# Altium footprint library ALL.PcbLib: 385 footprints (part 22 of 25)
Each footprint in its own frame and in the unit in brackets; x right, y up, seen from the top. Pads: shape width x height; smd on the part's side, far side on the other; paste and mask are expansions set on the pad; w line width, h text height; cw(c..) or ccw(c..) is an arc to the next point about the centre after c.
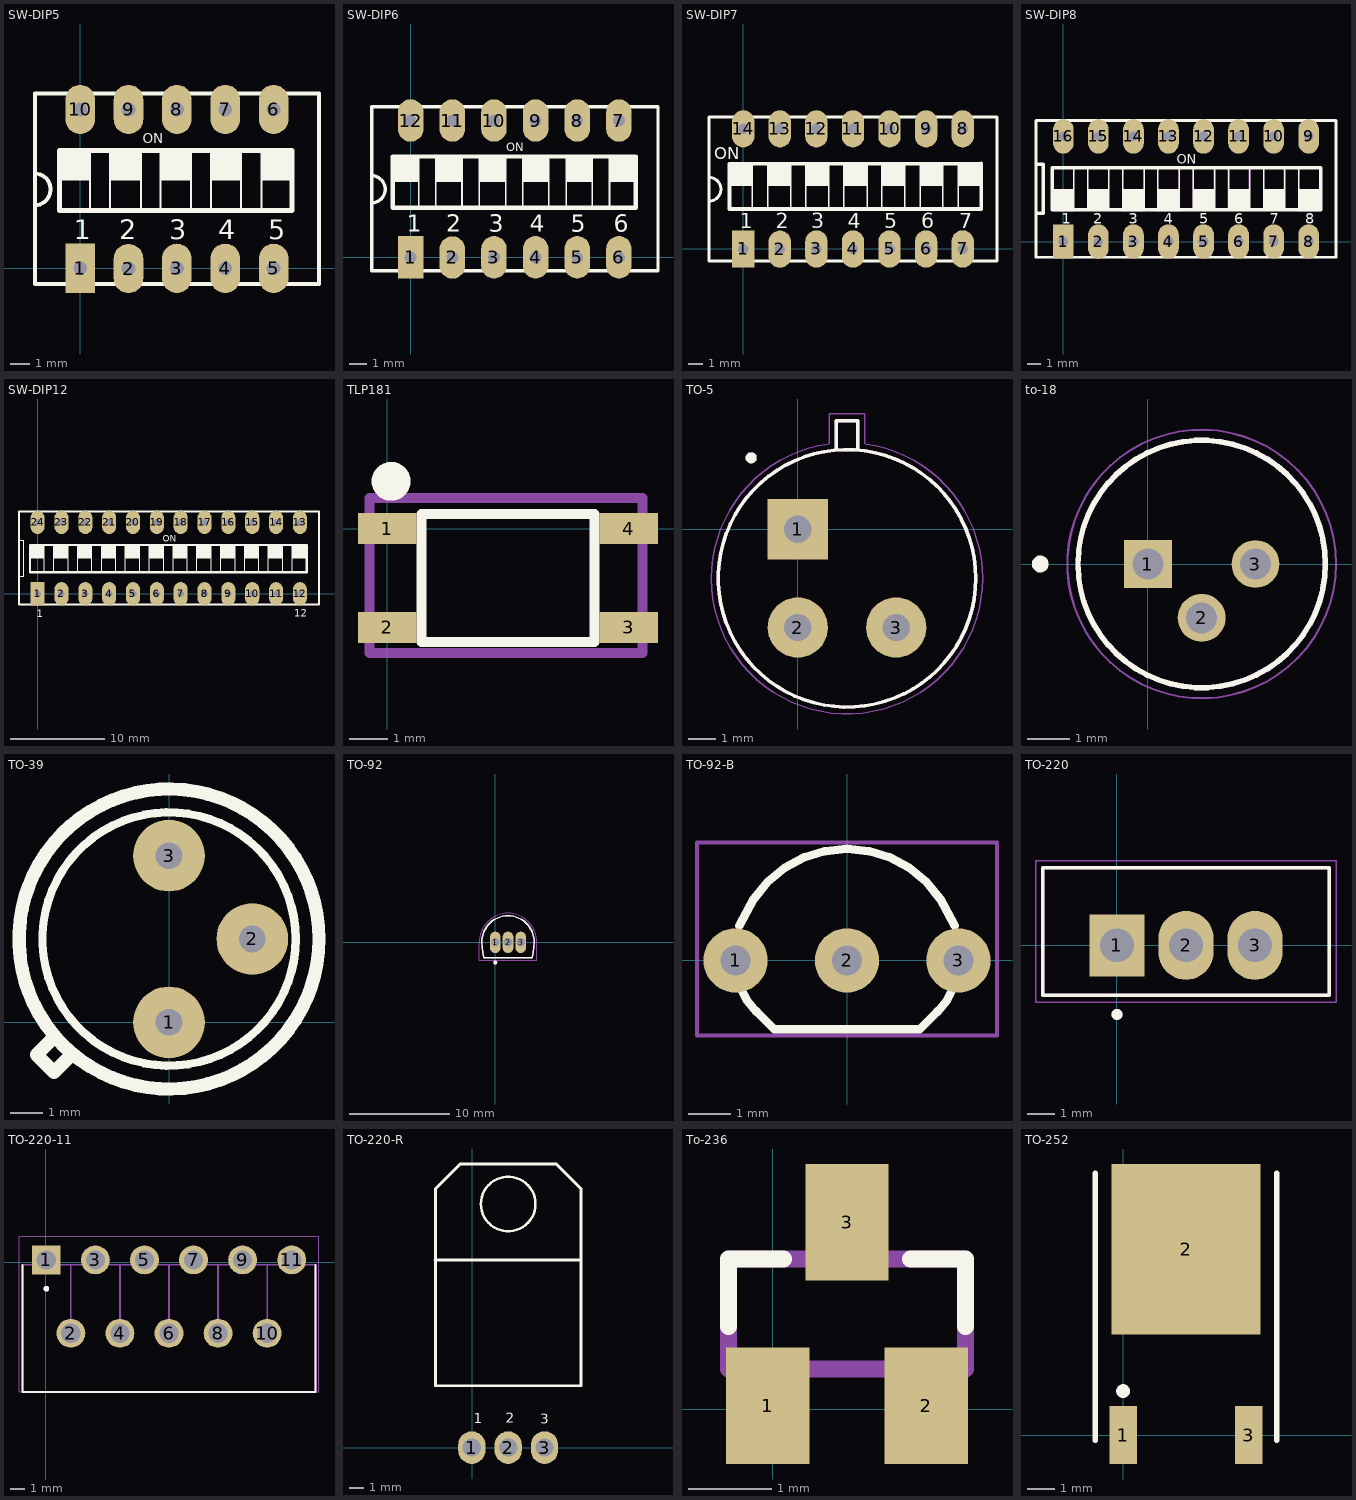
[diagram p21: the footprints below, top view; thin cyan lines are the x and y axes]

## SW-DIP5 [mm]
pads (10):
  rect 1.5x2.5 hole 0.7: 1(0,0)
  oval 1.5x2.5 hole 0.7: 2(2.45,-0.01) 3(4.9,0) 4(7.35,0) 5(9.8,0) 6(9.8,8.05) 7(7.35,8.05) 8(4.9,8.05) 9(2.45,8.05) 10(0,8.05)
Top Overlay:
  region: -1.046,5.97 -1.046,4.445 0.51,4.445 0.51,5.97
  region: 1.504,5.97 1.504,4.445 3.06,4.445 3.06,5.97
  region: 4.058,5.97 4.058,4.445 5.614,4.445 5.614,5.97
  region: 6.614,5.97 6.614,4.445 8.17,4.445 8.17,5.97
  region: 9.164,5.97 9.164,4.445 10.72,4.445 10.72,5.97
  lines w0.1: 0.5,2.92 0.5,5.94 ; 1.51,2.92 1.51,5.94 ; 3.07,2.92 3.07,5.94 ; 4.07,2.92 4.07,5.94 ; 5.61,2.92 5.61,5.94 ; 6.63,2.92 6.63,5.94 ; 8.16,2.92 8.16,5.94 ; 9.18,2.92 9.18,5.94
  lines w0.2: -2.3,3.202 ccw(c-2.3,4.002) -2.3,4.802 ; -2.3,-0.8 12.1,-0.8 12.1,8.85 -2.3,8.85 -2.3,-0.8
  lines w0.25: -1.04,2.92 -1.04,5.97
  lines w0.254: -1.04,2.92 10.72,2.92 10.72,5.97 -1.04,5.97
  text "5" at 9.52,1.465 h1
  text "4" at 6.99,1.465 h1
  text "3" at 4.5,1.465 h1
  text "2" at 1.98,1.465 h1
  text "1" at -0.33,1.465 h1
  text "ON" at 3.17,6.33 h0.5
3D body "User Library-Switch DIP 5 way flat slide Thru-Hole-19624.step": height 7.2, standoff -2, extent -2.22,-0.93 12.04,8.97

## SW-DIP6 [mm]
pads (12):
  rect 1.5x2.5 hole 0.7: 1(0,0)
  oval 1.5x2.5 hole 0.7: 2(2.45,-0.01) 3(4.9,0) 4(7.35,0) 5(9.8,0) 6(12.25,0) 7(12.25,8.05) 8(9.8,8.05) 9(7.35,8.05) 10(4.9,8.05) 11(2.45,8.05) 12(0,8.05)
Top Overlay:
  region: 11.684,5.96 11.684,4.435 13.24,4.435 13.24,5.96
  region: 9.134,5.96 9.134,4.435 10.69,4.435 10.69,5.96
  region: 6.578,5.96 6.578,4.435 8.134,4.435 8.134,5.96
  region: 4.024,5.96 4.024,4.435 5.58,4.435 5.58,5.96
  region: 1.474,5.96 1.474,4.435 3.03,4.435 3.03,5.96
  region: -1.076,5.96 -1.076,4.435 0.48,4.435 0.48,5.96
  lines w0.1: 0.47,2.91 0.47,5.93 ; 1.48,2.91 1.48,5.93 ; 3.02,2.91 3.02,5.93 ; 4.03,2.91 4.03,5.93 ; 5.59,2.91 5.59,5.93 ; 6.59,2.91 6.59,5.93 ; 8.13,2.91 8.13,5.93 ; 9.15,2.91 9.15,5.93 ; 10.68,2.91 10.68,5.93 ; 11.7,2.91 11.7,5.93
  lines w0.2: -2.3,3.202 ccw(c-2.3,4.002) -2.3,4.802 ; -2.3,-0.8 -2.3,8.85 14.55,8.85 14.55,-0.8 -2.3,-0.8
  lines w0.25: -1.06,2.91 -1.06,5.93
  lines w0.254: -1.06,2.91 13.24,2.91 13.24,5.93 -1.06,5.93
  text "ON" at 5.63,6.23 h0.5
  text "1" at -0.23,1.495 h1
  text "2" at 2.08,1.495 h1
  text "3" at 4.6,1.495 h1
  text "4" at 6.99,1.495 h1
  text "5" at 9.42,1.495 h1
  text "6" at 11.94,1.495 h1
3D body "User Library-106S.STEP": height 6.43, standoff -2.42, extent -2.19,-0.82 14.51,8.88

## SW-DIP7 [mm]
pads (14):
  rect 1.5x2.5 hole 0.7: 1(0,0)
  oval 1.5x2.5 hole 0.7: 2(2.45,-0.01) 3(4.9,0) 4(7.35,0) 5(9.8,0) 6(12.25,0) 7(14.7,0) 8(14.7,8.05) 9(12.25,8.05) 10(9.8,8.05) 11(7.35,8.05) 12(4.9,8.05) 13(2.45,8.05) 14(0,8.05)
Top Overlay:
  region: 14.384,5.73 14.384,4.205 15.94,4.205 15.94,5.73
  region: 11.834,5.73 11.834,4.205 13.39,4.205 13.39,5.73
  region: 9.278,5.73 9.278,4.205 10.834,4.205 10.834,5.73
  region: 6.724,5.73 6.724,4.205 8.28,4.205 8.28,5.73
  region: 4.174,5.73 4.174,4.205 5.73,4.205 5.73,5.73
  region: 1.624,5.73 1.624,4.205 3.18,4.205 3.18,5.73
  region: -0.936,5.73 -0.936,4.205 0.62,4.205 0.62,5.73
  lines w0.1: 0.61,2.68 0.61,5.7 ; 1.64,2.68 1.64,5.7 ; 3.17,2.68 3.17,5.7 ; 4.18,2.68 4.18,5.7 ; 5.72,2.68 5.72,5.7 ; 6.73,2.68 6.73,5.7 ; 8.29,2.68 8.29,5.7 ; 9.29,2.68 9.29,5.7 ; 10.83,2.68 10.83,5.7 ; 11.85,2.68 11.85,5.7 ; 13.38,2.68 13.38,5.7 ; 14.4,2.68 14.4,5.7
  lines w0.2: -2.3,3.202 ccw(c-2.3,4.002) -2.3,4.802 ; -2.3,-0.8 -2.3,8.85 17,8.85 17,-0.8 -2.3,-0.8
  lines w0.25: -0.92,2.68 -0.92,5.7
  lines w0.254: -0.92,2.68 15.94,2.68 15.94,5.73 -0.92,5.7
  text "ON" at -1.93,6.02 h0.8
  text "1" at -0.23,1.395 h1
  text "2" at 2.16,1.395 h1
  text "3" at 4.57,1.395 h1
  text "4" at 6.99,1.395 h1
  text "5" at 9.43,1.395 h1
  text "6" at 11.94,1.395 h1
  text "7" at 14.47,1.395 h1
3D body "User Library-DIPSWITCH7.step": height 7, standoff -3.1, extent -2.29,-1 16.85,9.16

## SW-DIP8 [mm]
pads (16):
  rect 1.5x2.5 hole 0.7: 1(0,0)
  oval 1.5x2.5 hole 0.7: 2(2.54,-0.01) 3(5.08,0) 4(7.62,0) 5(10.16,0) 6(12.7,0) 7(15.24,0) 8(17.78,0) 9(17.78,7.62) 10(15.24,7.62) 11(12.7,7.62) 12(10.16,7.62) 13(7.62,7.62) 14(5.08,7.62) 15(2.54,7.62) 16(0,7.62)
Top Overlay:
  region: 0.759,2.297 0.759,3.822 -0.797,3.822 -0.797,2.297
  region: 3.309,2.297 3.309,3.822 1.753,3.822 1.753,2.297
  region: 5.866,2.297 5.866,3.822 4.309,3.822 4.309,2.297
  region: 8.419,2.297 8.419,3.822 6.863,3.822 6.863,2.297
  region: 10.969,2.297 10.969,3.822 9.413,3.822 9.413,2.297
  region: 13.519,2.297 13.519,3.822 11.963,3.822 11.963,2.297
  region: 16.079,2.297 16.079,3.822 14.523,3.822 14.523,2.297
  region: 18.629,2.297 18.629,3.822 17.073,3.822 17.073,2.297
  lines w0.1: 0.743,2.327 0.743,5.347 ; 1.763,2.327 1.763,5.347 ; 3.293,2.327 3.293,5.347 ; 4.313,2.327 4.313,5.347 ; 5.853,2.327 5.853,5.347 ; 6.853,2.327 6.853,5.347 ; 8.413,2.327 8.413,5.347 ; 9.423,2.327 9.423,5.347 ; 10.963,2.327 10.963,5.347 ; 11.973,2.327 11.973,5.347 ; 13.503,2.327 13.503,5.347 ; 14.533,2.327 14.533,5.347 ; 16.063,2.327 16.063,5.347 ; 17.073,2.327 17.073,5.347
  lines w0.2: -1.981,-1.143 -1.981,8.763 19.761,8.763 19.761,-1.143 -1.981,-1.143
  lines w0.254: -1.94,2.032 -1.473,2.032 -1.473,5.588 -1.93,5.588 ; -0.797,2.297 18.653,2.297 18.653,5.347 -0.797,5.347 -0.797,2.297
  text "ON" at 8.23,5.65 h0.7
  text "1" at -0.101,1.295 h0.76
  text "2" at 2.163,1.295 h0.76
  text "3" at 4.723,1.295 h0.76
  text "4" at 7.284,1.295 h0.76
  text "5" at 9.844,1.295 h0.76
  text "6" at 12.405,1.295 h0.76
  text "7" at 14.965,1.295 h0.76
  text "8" at 17.526,1.295 h0.76
Mechanical 1:
  circle w0.025: c0,0 r0.254
  circle w0.025: c0,7.62 r0.254
  circle w0.025: c2.54,7.62 r0.254
  circle w0.025: c2.54,-0.01 r0.254
  circle w0.025: c5.08,0 r0.254
  circle w0.025: c5.08,7.62 r0.254
  circle w0.025: c7.62,7.62 r0.254
  circle w0.025: c7.62,0 r0.254
  circle w0.025: c10.16,0 r0.254
  circle w0.025: c10.16,7.62 r0.254
  circle w0.025: c12.7,7.62 r0.254
  circle w0.025: c12.7,0 r0.254
  circle w0.025: c15.24,0 r0.254
  circle w0.025: c15.24,7.62 r0.254
  circle w0.025: c17.78,7.62 r0.254
  circle w0.025: c17.78,0 r0.254
  lines w0.025: 0.762,5.334 0.762,5.41 -0.813,5.41 -0.813,2.235 0.762,2.235 0.762,5.359 ; 4.318,5.334 5.867,5.334 5.867,2.235 4.318,2.235 4.318,5.359 ; 6.833,5.309 8.407,5.309 8.407,2.235 6.833,2.235 6.833,5.359 ; 9.423,5.359 10.947,5.359 10.947,2.261 9.423,2.261 9.423,5.385 ; 11.938,5.309 13.487,5.309 13.487,2.261 11.938,2.261 11.938,5.359 ; 14.529,5.334 14.529,2.261 16.027,2.261 16.027,5.359 14.529,5.359 ; 17.069,5.334 18.694,5.334 18.694,2.235 17.069,2.235 17.069,5.359 ; -1.981,-1.143 19.761,-1.143 19.761,8.763 -1.981,8.763 -1.981,-1.143 ; -1.981,2.032 -1.981,5.588 -1.473,5.588 -1.473,2.032 -1.981,2.032 ; 1.778,2.261 3.302,2.261 3.302,5.334 1.778,5.334 1.778,2.261
3D body: height 5.59, standoff 0, extent 18.693,2.235 19.761,5.41
3D body: height 5.59, standoff 0, extent 16.154,2.236 17.069,5.411
3D body: height 5.59, standoff 0, extent 13.487,2.261 14.529,5.436
3D body: height 5.59, standoff 0, extent 11.048,2.262 11.938,5.437
3D body: height 5.59, standoff 0, extent 8.407,2.236 9.423,5.411
3D body: height 5.59, standoff 0, extent 5.866,2.236 6.832,5.411
3D body: height 5.59, standoff 0, extent 3.403,2.236 4.318,5.411
3D body: height 5.59, standoff 0, extent 0.762,2.235 1.778,5.41
3D body: height 5.59, standoff 0, extent -1.473,2.235 -0.813,5.41
3D body: height 5.59, standoff 0, extent -1.981,5.41 19.761,8.763
3D body: height 5.59, standoff 0, extent -1.981,-1.143 19.761,2.236
3D body: height 3.81, standoff 0, extent -1.981,2.032 -1.473,5.613
3D body: height 0.76, standoff 0, extent 2.287,7.367 2.793,7.873
3D body: height 0.76, standoff 0, extent 4.827,7.367 5.333,7.873
3D body: height 0.76, standoff 0, extent 7.367,7.367 7.873,7.873
3D body: height 0.76, standoff 0, extent -0.253,7.367 0.253,7.873
3D body: height 0.76, standoff 0, extent 17.527,7.367 18.033,7.873
3D body: height 0.76, standoff 0, extent 12.447,7.367 12.953,7.873
3D body: height 0.76, standoff 0, extent 14.987,7.367 15.493,7.873
3D body: height 5.08, standoff 0, extent 4.318,2.236 5.866,5.334
3D body: height 0.76, standoff 0, extent -0.253,-0.253 0.253,0.253
3D body: height 0.76, standoff 0, extent 2.287,-0.263 2.793,0.243
3D body: height 0.76, standoff 0, extent 4.827,-0.253 5.333,0.253
3D body: height 0.76, standoff 0, extent 7.367,-0.253 7.873,0.253
3D body: height 5.08, standoff 0, extent 6.832,2.339 8.405,5.411
3D body: height 5.08, standoff 0, extent 14.528,2.26 16.028,5.36
3D body: height 5.08, standoff 0, extent 17.069,2.313 18.693,5.411
3D body: height 0.76, standoff 0, extent 9.907,-0.253 10.413,0.253
3D body: height 0.76, standoff 0, extent 12.447,-0.253 12.953,0.253
3D body: height 0.76, standoff 0, extent 14.987,-0.253 15.493,0.253
3D body: height 0.76, standoff 0, extent 17.527,-0.253 18.033,0.253
3D body: height 5.08, standoff 0, extent 14.529,2.338 16.153,5.436
3D body: height 5.08, standoff 0, extent 11.938,2.339 13.563,5.437
3D body: height 5.08, standoff 0, extent 9.423,2.262 11.048,5.359
3D body: height 5.08, standoff 0, extent 1.778,2.312 3.403,5.41
3D body: height 5.08, standoff 0, extent -0.813,2.312 0.812,5.41
3D body: height 6.35, standoff 0, extent -0.813,2.235 0.812,3.759
3D body: height 6.35, standoff 0, extent 1.778,2.261 3.403,3.785
3D body: height 6.35, standoff 0, extent 4.318,2.236 5.943,3.76
3D body: height 6.35, standoff 0, extent 6.833,2.236 8.457,3.76
3D body: height 6.35, standoff 0, extent 9.423,2.262 11.048,3.786
3D body: height 6.35, standoff 0, extent 11.938,2.261 13.563,3.785
3D body: height 6.35, standoff 0, extent 14.529,2.236 16.154,3.76
3D body: height 6.35, standoff 0, extent 17.069,2.235 18.693,3.759
3D body: height 0.76, standoff 0, extent 9.867,7.337 10.373,7.843
3D body: height 5.59, standoff 0.25, extent 0.959,5.745 2.525,7.297
3D body: height 5.59, standoff 0.03, extent -0.394,5.82 0.414,7.237
3D body: height 5.59, standoff 0.25, extent -0.796,5.735 0.822,7.309

## SW-DIP12 [mm]
pads (24):
  rect 1.5x2.5 hole 0.7: 1(0,0)
  oval 1.5x2.5 hole 0.7: 2(2.54,0) 3(5.08,0) 4(7.62,0) 5(10.16,0) 6(12.7,0) 7(15.24,0) 8(17.78,0) 9(20.32,0) 10(22.86,0) 11(25.4,0) 12(27.94,0) 13(27.94,7.62) 14(25.4,7.62) 15(22.86,7.62) 16(20.32,7.62) 17(17.78,7.62) 18(15.24,7.62) 19(12.7,7.62) 20(10.16,7.62) 21(7.62,7.62) 22(5.08,7.62) 23(2.54,7.62) 24(0,7.62)
Top Overlay:
  region: 0.712,3.752 0.712,5.198 -0.812,5.198 -0.812,3.752
  region: 3.252,3.752 3.252,5.198 1.728,5.198 1.728,3.752
  region: 5.792,3.752 5.792,5.198 4.268,5.198 4.268,3.752
  region: 8.332,3.752 8.332,5.198 6.808,5.198 6.808,3.752
  region: 10.872,3.752 10.872,5.198 9.348,5.198 9.348,3.752
  region: 13.412,3.752 13.412,5.198 11.888,5.198 11.888,3.752
  region: 15.952,3.752 15.952,5.198 14.428,5.198 14.428,3.752
  region: 18.492,3.752 18.492,5.198 16.968,5.198 16.968,3.752
  region: 21.032,3.752 21.032,5.198 19.508,5.198 19.508,3.752
  region: 23.572,3.752 23.572,5.198 22.048,5.198 22.048,3.752
  region: 26.112,3.752 26.112,5.198 24.588,5.198 24.588,3.752
  region: 28.652,3.752 28.652,5.198 27.128,5.198 27.128,3.752
  lines w0.1: -0.812,2.307 -0.812,5.198 ; 0.712,2.307 0.712,5.198 ; 1.728,2.307 1.728,5.198 ; 3.252,2.307 3.252,5.198 ; 4.268,2.307 4.268,5.198 ; 5.792,2.307 5.792,5.198 ; 6.808,2.307 6.808,5.198 ; 8.332,2.307 8.332,5.198 ; 9.348,2.307 9.348,5.198 ; 10.872,2.307 10.872,5.198 ; 11.888,2.307 11.888,5.198 ; 13.412,2.307 13.412,5.198 ; 14.428,2.307 14.428,5.198 ; 15.952,2.307 15.952,5.198 ; 16.968,2.307 16.968,5.198 ; 18.492,2.307 18.492,5.198 ; 19.508,2.307 19.508,5.198 ; 21.032,2.307 21.032,5.198 ; 22.048,2.307 22.048,5.198 ; 23.572,2.307 23.572,5.198 ; 24.588,2.307 24.588,5.198 ; 26.112,2.307 26.112,5.198 ; 27.128,2.307 27.128,5.198
  lines w0.127: -1.981,1.9 -1.473,1.9 -1.473,5.71 -1.981,5.71
  lines w0.2: -1.981,-1.143 29.972,-1.143 29.972,8.763 -1.981,8.763 -1.981,-1.143
  lines w0.254: -0.812,2.307 -0.812,5.198 28.652,5.198 28.652,2.307 -0.812,2.307
  text "1" at -0.08,-2.51 h0.76
  text "12" at 27.36,-2.43 h0.76
  text "ON" at 13.34,5.55 h0.7
Mechanical 1:
  circle w0.025: c0,7.62 r0.254
  circle w0.025: c2.54,7.62 r0.254
  circle w0.025: c5.08,7.62 r0.254
  circle w0.025: c7.62,7.62 r0.254
  circle w0.025: c7.62,0 r0.254
  circle w0.025: c5.08,0 r0.254
  circle w0.025: c2.54,-0.01 r0.254
  circle w0.025: c0,0 r0.254
  circle w0.025: c10.16,0 r0.254
  circle w0.025: c10.16,7.62 r0.254
  circle w0.025: c12.7,7.62 r0.254
  circle w0.025: c12.7,0 r0.254
  circle w0.025: c15.24,0 r0.254
  circle w0.025: c17.78,7.62 r0.254
  circle w0.025: c17.78,0 r0.254
3D body: height 5.59, standoff 0, extent 0.712,2.307 1.728,5.198
3D body: height 5.08, standoff 0.25, extent -0.812,2.307 0.712,4.487
3D body: height 6.35, standoff 0.25, extent -0.812,4.487 0.712,5.198
3D body: height 5.59, standoff 0, extent 3.252,2.307 4.268,5.198
3D body: height 5.08, standoff 0.25, extent 1.728,2.307 3.252,4.487
3D body: height 6.35, standoff 0.25, extent 1.728,4.487 3.252,5.198
3D body: height 5.59, standoff 0, extent 5.792,2.307 6.808,5.198
3D body: height 5.08, standoff 0.25, extent 4.268,2.307 5.792,4.487
3D body: height 6.35, standoff 0.25, extent 4.268,4.487 5.792,5.198
3D body: height 5.59, standoff 0, extent 8.332,2.307 9.348,5.198
3D body: height 5.08, standoff 0.25, extent 6.808,2.307 8.332,4.487
3D body: height 6.35, standoff 0.25, extent 6.808,4.487 8.332,5.198
3D body: height 5.59, standoff 0, extent 10.872,2.307 11.888,5.198
3D body: height 5.08, standoff 0.25, extent 9.348,2.307 10.872,4.487
3D body: height 6.35, standoff 0.25, extent 9.348,4.487 10.872,5.198
3D body: height 5.59, standoff 0, extent 13.412,2.307 14.428,5.198
3D body: height 5.08, standoff 0.25, extent 11.888,2.307 13.412,4.487
3D body: height 6.35, standoff 0.25, extent 11.888,4.487 13.412,5.198
3D body: height 5.59, standoff 0, extent 15.952,2.307 16.968,5.198
3D body: height 5.08, standoff 0.25, extent 14.428,2.307 15.952,4.487
3D body: height 6.35, standoff 0.25, extent 14.428,4.487 15.952,5.198
3D body: height 5.59, standoff 0, extent 18.492,2.307 19.508,5.198
3D body: height 5.08, standoff 0.25, extent 16.968,2.307 18.492,4.487
3D body: height 6.35, standoff 0.25, extent 16.968,4.487 18.492,5.198
3D body: height 6.35, standoff 0.25, extent 24.588,4.487 26.112,5.198
3D body: height 5.08, standoff 0.25, extent 24.588,2.307 26.112,4.487
3D body: height 5.59, standoff 0, extent 23.572,2.307 24.588,5.198
3D body: height 5.59, standoff 0, extent 21.032,2.307 22.048,5.198
3D body: height 5.59, standoff 0, extent 26.112,2.307 27.128,5.198
3D body: height 5.59, standoff 0, extent -1.473,2.362 -0.762,5.253
3D body: height 6.35, standoff 0.25, extent 19.508,4.487 21.032,5.198
3D body: height 5.08, standoff 0.25, extent 19.508,2.307 21.032,4.487
3D body: height 6.35, standoff 0.25, extent 22.048,4.487 23.572,5.198
3D body: height 5.08, standoff 0.25, extent 22.048,2.307 23.572,4.487
3D body: height 5.08, standoff 0.25, extent 27.128,2.307 28.652,4.487
3D body: height 0.25, standoff 0.05, extent -1.981,-1.143 29.972,8.763
3D body: height 5.59, standoff 0, extent -1.981,-1.143 29.972,8.763
3D body: height 3.81, standoff 0, extent -1.981,1.9 -1.473,5.71
3D body: height 0.76, standoff 0, extent 7.367,-0.253 7.873,0.253
3D body: height 0.76, standoff 0, extent 4.827,-0.253 5.333,0.253
3D body: height 0.76, standoff 0, extent 2.287,-0.263 2.793,0.243
3D body: height 0.76, standoff 0, extent -0.253,-0.253 0.253,0.253
3D body: height 0.76, standoff 0, extent 7.367,7.367 7.873,7.873
3D body: height 0.76, standoff 0, extent 4.827,7.367 5.333,7.873
3D body: height 0.76, standoff 0, extent 2.287,7.367 2.793,7.873
3D body: height 0.76, standoff 0, extent -0.253,7.367 0.253,7.873
3D body: height 6.35, standoff 0.25, extent 27.128,4.487 28.652,5.198
3D body: height 0.76, standoff 0, extent 14.987,7.367 15.493,7.873
3D body: height 0.76, standoff 0, extent 17.527,7.367 18.033,7.873
3D body: height 0.76, standoff 0, extent 12.447,7.367 12.953,7.873
3D body: height 0.76, standoff 0, extent 9.907,-0.253 10.413,0.253
3D body: height 0.76, standoff 0, extent 12.447,-0.253 12.953,0.253
3D body: height 0.76, standoff 0, extent 14.987,-0.253 15.493,0.253
3D body: height 0.76, standoff 0, extent 17.527,-0.253 18.033,0.253
3D body: height 0.76, standoff 0, extent 20.067,-0.253 20.573,0.253
3D body: height 0.76, standoff 0, extent 22.607,-0.253 23.113,0.253
3D body: height 0.76, standoff 0, extent 25.147,-0.253 25.653,0.253
3D body: height 0.76, standoff 0, extent 27.687,-0.253 28.193,0.253
3D body: height 0.76, standoff 0, extent 27.687,7.367 28.193,7.873
3D body: height 0.76, standoff 0, extent 25.147,7.367 25.653,7.873
3D body: height 0.76, standoff 0, extent 22.607,7.367 23.113,7.873
3D body: height 0.76, standoff 0, extent 20.067,7.367 20.573,7.873
3D body: height 5.59, standoff 0.25, extent 0.799,6.015 2.365,7.567
3D body: height 5.59, standoff 0.03, extent -0.554,6.09 0.254,7.507
3D body: height 5.59, standoff 0.25, extent -0.956,6.005 0.662,7.579

## TLP181 [mm]
pads (4):
  rect 1.5x0.8 smd: 1(0,0) 2(0,-2.54) 3(6.223,-2.54) 4(6.223,0)
Top Overlay:
  circle w0.5: c0.102,1.219 r0.25
  lines w0.254: 0.889,-2.921 5.334,-2.921 5.334,0.381 0.889,0.381 0.889,-2.921
Mechanical 15:
  lines w0.254: -0.457,-3.2 -0.457,0.787 6.579,0.787 6.579,-3.2 -0.457,-3.2
3D body "User Library-PS2701_optocoupler.step": height 1.89, standoff -0.02, extent -0.427,-3.245 6.573,0.755

## TO-5 [mm]
pads (3):
  rect 2.2x2.2 hole 1: 1(0,0)
  round 2.2 hole 1: 2(0,-3.592) 3(3.592,-3.592)
Top Overlay:
  circle w0.2: c-1.704,2.604 r0.1
  circle w0.127: c1.796,-1.796 r4.7
  lines w0.127: 1.396,2.897 1.396,3.954 2.196,3.954 2.196,2.897
Mechanical 13:
  circle w0.2: c-1.704,2.604 r0.1
  circle w0.127: c1.796,-1.796 r4.7
  lines w0.127: 1.397,2.897 1.397,3.954 2.196,3.954 2.196,2.897
Mechanical 15:
  lines w0.05: -3.154,-1.797 cw(c1.798,-1.797) 1.108,3.106 ; -3.154,-1.796 ccw(c1.796,-1.796) 6.746,-1.796 ; 1.146,3.111 1.146,4.204 2.446,4.204 2.446,3.111 ; 2.484,3.106 cw(c1.795,-1.797) 6.746,-1.797
3D body "User Library-PIR_S_Orginal.STEP": height 4.7, standoff -2, extent -4.58,-8.289 8.289,4.581

## to-18 [mm]
pads (3):
  rect 1.13x1.13 hole 0.73: 1(0,0)
  round 1.13 hole 0.73: 2(1.27,-1.27) 3(2.54,0)
Top Overlay:
  circle w0.127: c1.27,0 r2.92
  circle w0.2: c-2.54,0 r0.1
Mechanical 13:
  circle w0.127: c1.27,0 r2.92
Mechanical 15:
  circle w0.05: c1.27,0 r3.17
3D body "2N2222A--3DModel-STEP-269445 (1).STEP": height 5.85, standoff -18.54, extent -1.508,-2.634 4.302,3.175

## TO-39 [mil]
pads (3):
  round 86 hole 32: 1(0,0) 2(100,100) 3(0,200)
Top Overlay:
  circle w16: c0,100 r180
  circle w10: c0,100 r152
  lines w16: -138,-18 -159,-39 -138,-60 -117,-39
3D body "2N3440.STEP": height 260, standoff -500, extent -173,-66.97 187,293

## TO-92 [mm]
pads (3):
  oval 1.07x2.14 hole 0.85: 1(0,0) 2(1.27,0) 3(2.54,0)
Top Overlay:
  circle w0.2: c0,-2 r0.1
  lines w0.127: -1.336,0.033 ccw(c7.448,0.34) -1.15,-1.487 ; -1.335,-0.014 cw(c1.302,0.032) 1.256,2.67 ; -1.142,-1.52 3.682,-1.52 ; 1.284,2.67 cw(c1.238,0.032) 3.875,-0.014 ; 3.69,-1.487 ccw(c-4.908,0.34) 3.876,0.033
Mechanical 13:
  circle w0.2: c0,-2 r0.1
  lines w0.127: -1.336,0.033 ccw(c7.448,0.34) -1.15,-1.487 ; -1.335,-0.014 cw(c1.302,0.032) 1.256,2.67 ; -1.142,-1.52 3.682,-1.52 ; 1.284,2.67 cw(c1.238,0.032) 3.875,-0.014 ; 3.69,-1.487 ccw(c-4.908,0.34) 3.876,0.033
Mechanical 15:
  lines w0.05: -1.585,-0.018 cw(c1.302,0.032) 1.252,2.92 ; -1.585,0 -1.585,-1.77 4.125,-1.77 4.125,0 ; 1.288,2.92 cw(c1.238,0.032) 4.125,-0.018
3D body "step_temp.STEP": height 5.34, standoff -12.7, extent -1.142,-1.457 3.682,2.223

## TO-92-B [mm]
pads (3):
  round 1.5 hole 0.7: 1(-2.6,0) 2(0,0) 3(2.6,0)
Top Overlay:
  lines w0.2: -2.512,0.806 -2.173,1.441 -1.848,1.837 -1.452,2.162 -1,2.403 -0.51,2.552 0,2.602 0.51,2.552 1,2.403 1.452,2.162 1.848,1.837 2.173,1.441 2.512,0.806 ; -2.443,-0.723 -2.326,-0.941 -2.118,-1.195 -2.112,-1.189 -1.7,-1.601 1.7,-1.601 2.112,-1.189 2.118,-1.195 2.326,-0.941 2.424,-0.759
Mechanical 15:
  lines w0.1: -3.5,-1.75 -3.5,2.75 3.5,2.75 3.5,-1.75 -3.5,-1.75
3D body "User Library-TO-92_Bent.STEP": height 7.5, standoff -5.5, extent -2.79,-1.59 2.79,2.613

## TO-220 [mil]
pads (3):
  rect 80x90 hole 48.82: 1(0,0)
  oval 80x100 hole 48.82: 2(100,0) 3(200,0)
Top Overlay:
  circle w7.87: c0,-100 r3.94
  lines w5: -107.48,-72.44 307.48,-72.44 307.48,112.6 -107.48,112.6 -107.48,-72.44
Mechanical 13:
  circle w7.87: c0,-100 r3.94
  lines w5: -107.48,-72.44 307.48,-72.44 307.48,112.6 -107.48,112.6 -107.48,-72.44
Mechanical 15:
  lines w1.97: -117.32,-82.28 317.32,-82.28 317.32,122.44 -117.32,122.44 -117.32,-82.28
3D body "LM317T (1).STEP": height 900, standoff -329.92, extent -100,-65.16 300,100

## TO-220-11 [mm]
pads (11):
  rect 2x2 hole 1.33: 1(0.051,0.178)
  round 2 hole 1.33: 2(1.751,-4.902) 3(3.451,0.178) 4(5.151,-4.902) 5(6.851,0.178) 6(8.551,-4.902) 7(10.251,0.178) 8(11.951,-4.902) 9(13.651,0.178) 10(15.351,-4.902) 11(17.051,0.178)
Top Overlay:
  circle w0.2: c0.051,-1.822 r0.1
  lines w0.127: -1.589,-0.152 -1.589,-8.966 18.691,-8.966 18.691,-0.152
Mechanical 13:
  circle w0.2: c0.051,-1.822 r0.1
  lines w0.127: 1.751,-3.902 1.751,-0.152 ; 5.151,-3.902 5.151,-0.152 ; 8.551,-3.902 8.551,-0.152 ; 11.951,-3.902 11.951,-0.152 ; 15.351,-3.902 15.351,-0.152 ; 1.751,-0.152 -1.589,-0.152 -1.589,-8.966 18.691,-8.966 18.691,-0.152 15.351,-0.152 ; 1.751,-0.152 5.151,-0.152 ; 5.151,-0.152 8.551,-0.152 ; 8.551,-0.152 11.951,-0.152 ; 11.951,-0.152 15.351,-0.152
Mechanical 15:
  lines w0.05: -1.839,-8.966 18.941,-8.966 18.941,1.829 -1.839,1.829 -1.839,-8.966
3D body "LM3886T.STEP": height 22.1, standoff -3.2, extent -1.321,-9.22 18.694,0.356

## TO-220-R [mil]
pads (3):
  oval 75x90 hole 50: 1(-1,1) 2(99,1) 3(199,1)
Top Overlay:
  circle w7: c99,671 r75
  lines w7.87: -102,517.22 298,517.22 ; -101,171 -101,579.74 -101,713 -33,781 231,781 299,713 299,171 -101,171
  text "3" at 187,66 h27.56
  text "2" at 92,69 h27.56
  text "1" at 4,67.93 h27.56
3D body "78XXCV.STEP": height 175, standoff -112.5, extent -99,-7 301,777

## To-236 [mm]
pads (3):
  rect 1x1.4 smd: 1(-0.061,0.043) 2(1.839,0.043) 3(0.889,2.243)
Top Overlay:
  lines w0.203: -0.533,0.991 -0.533,1.803 0.125,1.803 ; 1.653,1.803 2.311,1.803 2.311,0.991
Mechanical 13:
  region: 1.118,1.855 0.66,1.855 0.66,2.438 1.118,2.438
  region: 2.057,-0.154 1.601,-0.154 1.601,0.432 2.057,0.432
  region: 0.178,-0.153 -0.28,-0.153 -0.28,0.432 0.178,0.432
  lines w0.203: -0.533,0.483 2.311,0.483 2.311,1.803 -0.533,1.803 -0.533,0.483
3D body "FDN337N (1).STEP": height 1.12, standoff 0, extent -0.571,-0.112 2.349,2.398

## TO-252 [mm]
pads (3):
  rect 1x2.1 smd: 1(0,0) 3(4.57,0)
  rect 5.4x6.2 smd: 2(2.285,6.75)
Top Overlay:
  circle w0.25: c0,1.6 r0.125
  lines w0.2: -1.005,-0.193 -1.005,9.507 ; 5.575,-0.193 5.575,9.507
3D body "CircuitWorks-TO-252.step": height 2.3, standoff 0, extent -1.005,-0.193 5.575,9.507